# Altium schematic symbol library IC_ADI.SCHLIB: 3169 symbols (part 130 of 181)
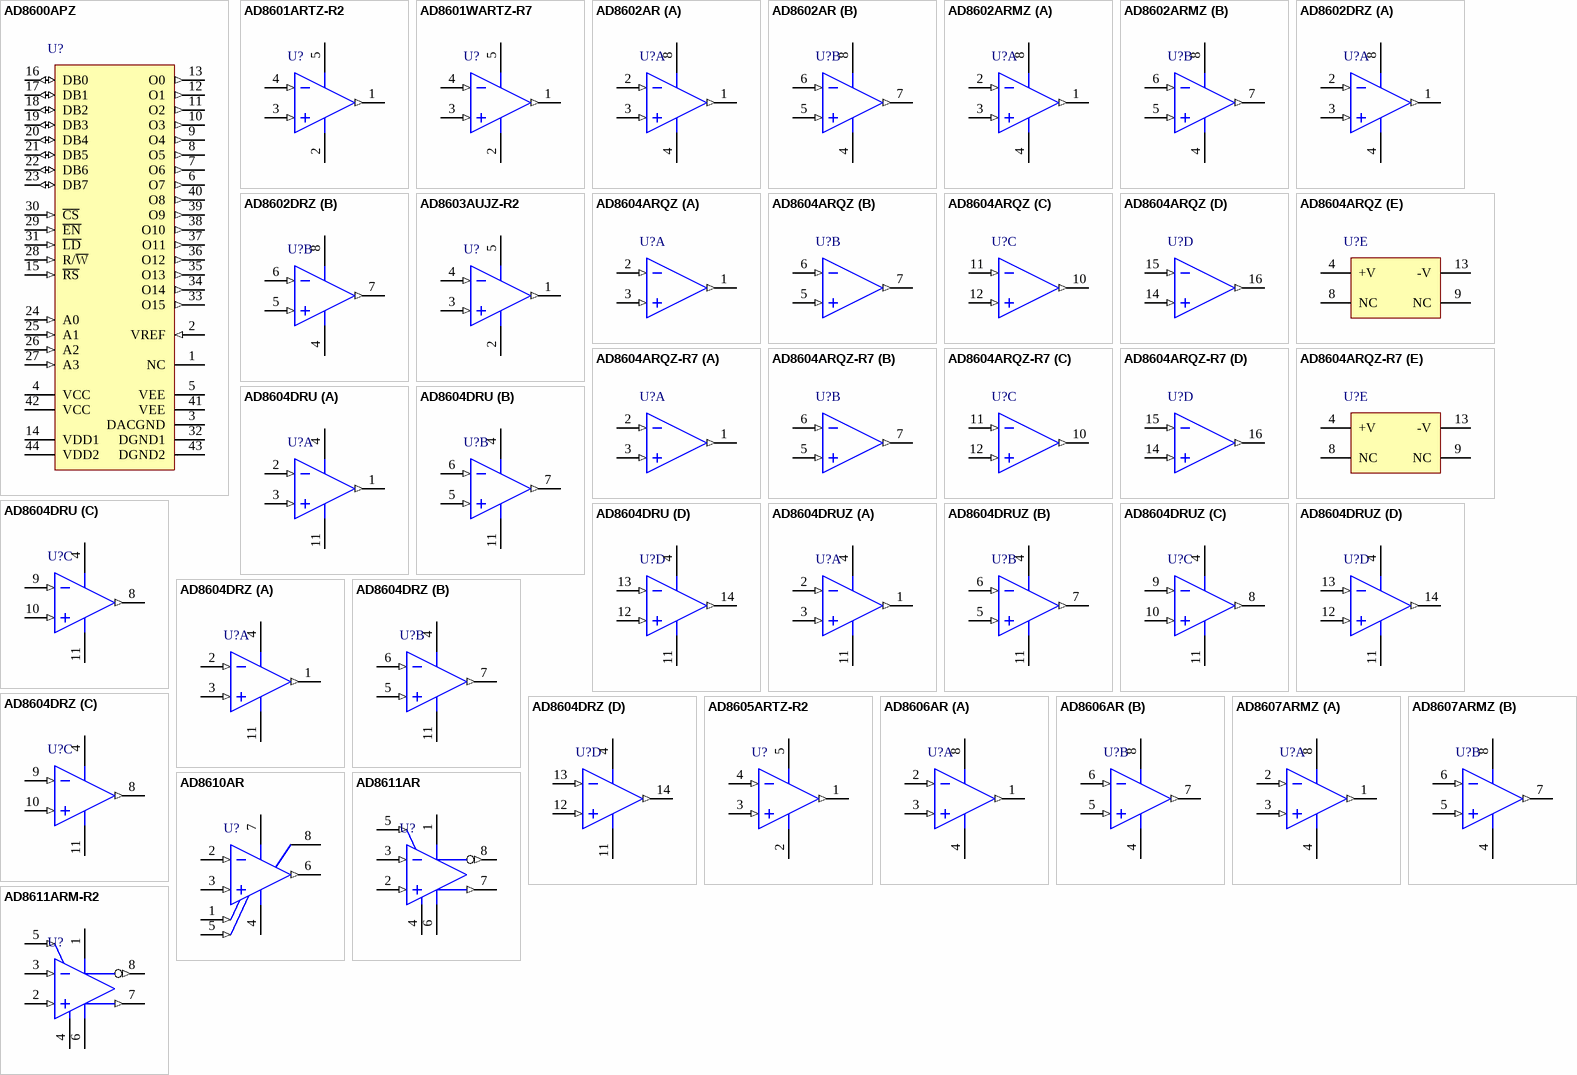
[diagram p320: symbols AD8600APZ to AD8611ARM-R2]

## AD8601ARTZ-R2
designator U?
Single Channel Wide Bandwidth Operational Amplifier, 8.4 MHz BW, 6 V/us SR, Industrial, 5-pin SOT23 (RJ-5), Reel; Generic Part Number: AD8601; PartNumber: AD8601ARTZ-R2; Amplifiers Per Package: 1; Automotive Qualified: Yes; Input Bias Current: 200fA; Input Offset Voltage: 80uV; Iq/Amp: 1.2mA; Slew Rate: 6V/us; Small Signal Bandwidth: 8.4MHz; V Span Max: 5.5V; V Span Min: 2.7V; DatasheetVersion: Rev. G; PackageVersion: 121608-A; PackageReference: RJ-5; PackageDescription: 5-Pin Small Outline Transistor Package, Body 2.9 x 1.6 mm, Pitch 0.95 mm; Supplier Part Number 1: AD8601ARTZ-R2TR-ND; Supplier Part Number 2: AD8601ARTZ-R2CT-ND; Supplier Part Number 3: AD8601ARTZ-R2DKR-ND; Supplier Part Number 4: 1319466; Supplier Part Number 5: 19M8922; Mounting Technology: Surface Mount; Code_JEDEC: MO-178-AA; ComponentLink1Description: Manufacturer URL; ComponentLink2Description: Datasheet; ComponentLink3Description: Package Specification; ComponentLink4Description: Reference Circuit
footprint SOT23-5 (Footprint not found)
pins: 1 OUT A (out), 2 -V (power), 3 +IN (in), 4 -IN (in), 5 +V (power)

## AD8601WARTZ-R7
designator U?
Single Channel Wide Bandwidth Operational Amplifier, 8.4 MHz BW, 6 V/us SR, Automotive, 5-pin SOT23 (RJ-5), Reel; Generic Part Number: AD8601; PartNumber: AD8601WARTZ-R7; Amplifiers Per Package: 1; Automotive Qualified: Yes; Input Bias Current: 200fA; Input Offset Voltage: 80uV; Iq/Amp: 1.2mA; Slew Rate: 6V/us; Small Signal Bandwidth: 8.4MHz; V Span Max: 5.5V; V Span Min: 2.7V; DatasheetVersion: Rev. G; PackageVersion: 121608-A; PackageReference: RJ-5; PackageDescription: 5-Pin Small Outline Transistor Package, Body 2.9 x 1.6 mm, Pitch 0.95 mm; Supplier Part Number 1: AD8601WARTZ-R7TR-ND; Supplier Part Number 2: AD8601WARTZ-R7CT-ND; Supplier Part Number 3: AD8601WARTZ-R7DKR-ND; Mounting Technology: Surface Mount; Code_JEDEC: MO-178-AA; ComponentLink1Description: Manufacturer URL; ComponentLink2Description: Datasheet; ComponentLink3Description: Package Specification; ComponentLink4Description: Reference Circuit
footprint SOT23-5 (Footprint not found)
pins: 1 OUT A (out), 2 -V (power), 3 +IN (in), 4 -IN (in), 5 +V (power)

## AD8602AR
designator U?
Double Channel Wide Bandwidth Operational Amplifier, 8.4 MHz BW, 6 V/us SR, Industrial, 8-pin SOIC (R-8), Tube; Generic Part Number: AD8602; PartNumber: AD8602AR; Amplifiers Per Package: 2; Automotive Qualified: Yes; Input Bias Current: 200fA; Input Offset Voltage: 500uV; Iq/Amp: 1.2mA; Slew Rate: 6V/us; Small Signal Bandwidth: 8.4MHz; V Span Max: 6V; V Span Min: 2.7V; DatasheetVersion: Rev. G; PackageVersion: 060506-A; PackageReference: R-8; PackageDescription: 8-Pin Standard Small Outline Package, Body 3.9 x 4.9 mm, Pitch 1.27 mm; Supplier Part Number 1: AD8602AR-ND; Mounting Technology: Surface Mount; Code_JEDEC: MS-012-AA; ComponentLink1Description: Manufacturer URL; ComponentLink2Description: Datasheet; ComponentLink3Description: Package Specification
footprint SOIC8_1.27 (Footprint not found)
pins on every part: 4 -V (power), 8 +V (power)
part A pins: 1 OUT A (out), 2 -IN A (in), 3 +IN A (in)
part B pins: 5 +IN B (in), 6 -IN B (in), 7 OUT B (out)

## AD8602ARMZ
designator U?
Double Channel Wide Bandwidth Operational Amplifier, 8.4 MHz BW, 6 V/us SR, Industrial, 8-pin SOP (RM-8), Tube; Generic Part Number: AD8602; PartNumber: AD8602ARMZ; Amplifiers Per Package: 2; Automotive Qualified: Yes; Input Bias Current: 200fA; Input Offset Voltage: 500uV; Iq/Amp: 1.2mA; Slew Rate: 6V/us; Small Signal Bandwidth: 8.4MHz; V Span Max: 6V; V Span Min: 2.7V; DatasheetVersion: Rev. G; PackageReference: RM-8; PackageDescription: 8-Pin Mini Small Outline Package, Body 3 x 3 mm, Pitch 0.65 mm; Supplier Part Number 1: AD8602ARMZ-ND; Supplier Part Number 2: 1838872; Supplier Part Number 3: 19P8306; Mounting Technology: Surface Mount; Code_JEDEC: MO-187-AA; ComponentLink1Description: Manufacturer URL; ComponentLink2Description: Datasheet; ComponentLink3Description: Package Specification
footprint VSSOP8_0.65 (Footprint not found)
pins on every part: 4 -V (power), 8 +V (power)
part A pins: 1 OUT A (out), 2 -IN A (in), 3 +IN A (in)
part B pins: 5 +IN B (in), 6 -IN B (in), 7 OUT B (out)

## AD8602DRZ
designator U?
Double Channel Wide Bandwidth Operational Amplifier, 8.4 MHz BW, 6 V/us SR, Industrial, 8-pin SOIC (R-8), Tube; Generic Part Number: AD8602; PartNumber: AD8602DRZ; Amplifiers Per Package: 2; Automotive Qualified: Yes; Input Bias Current: 200fA; Input Offset Voltage: 500uV; Iq/Amp: 1.2mA; Slew Rate: 6V/us; Small Signal Bandwidth: 8.4MHz; V Span Max: 6V; V Span Min: 2.7V; DatasheetVersion: Rev. G; PackageVersion: 060506-A; PackageReference: R-8; PackageDescription: 8-Pin Standard Small Outline Package, Body 3.9 x 4.9 mm, Pitch 1.27 mm; Supplier Part Number 1: AD8602DRZ-ND; Supplier Part Number 2: 59K6900; Mounting Technology: Surface Mount; Code_JEDEC: MS-012-AA; ComponentLink1Description: Manufacturer URL; ComponentLink2Description: Datasheet; ComponentLink3Description: Package Specification
footprint SOIC8_1.27 (Footprint not found)
pins on every part: 4 -V (power), 8 +V (power)
part A pins: 1 OUT A (out), 2 -IN A (in), 3 +IN A (in)
part B pins: 5 +IN B (in), 6 -IN B (in), 7 OUT B (out)

## AD8603AUJZ-R2
designator U?
Single Channel Single-Supply Operation Operational Amplifier, 400 KHz BW, 100 mV/us SR, Industrial, 5-pin SOT23 (UJ-5), Reel; Generic Part Number: AD8603; PartNumber: AD8603AUJZ-R2; Amplifiers Per Package: 1; Input Bias Current: 200fA; Input Offset Voltage: 12uV; Iq/Amp: 50uA; Small Signal Bandwidth: 400KHz; V Span Max: 6V; V Span Min: 1.8V; DatasheetVersion: Rev. C; PackageVersion: 100708-A; PackageReference: UJ-5; PackageDescription: 5-Pin Thin Small Outline Transistor Package, Body 2.9 x 1.6 mm, Pitch 0.95 mm; Supplier Part Number 1: AD8603AUJZ-R2TR-ND; Supplier Part Number 2: AD8603AUJZ-R2CT-ND; Supplier Part Number 3: AD8603AUJZ-R2DKR-ND; Supplier Part Number 4: 1319467; Supplier Part Number 5: 19M8923; Supplier Part Number 6: 59K6905; Slew Rate: 100mV/us; Mounting Technology: Surface Mount; Code_JEDEC: MO-193-AB; ComponentLink1Description: Manufacturer URL; ComponentLink2Description: Datasheet; ComponentLink3Description: Package Specification; ComponentLink4Description: Reference Circuit
footprint SOT23-5 (Footprint not found)
pins: 1 OUT (out), 2 -V (power), 3 +IN (in), 4 -IN (in), 5 +V (power)

## AD8604ARQZ
designator U?
Quad Channel Wide Bandwidth Operational Amplifier, 8.4 MHz BW, 6 V/us SR, Industrial, 16-pin SOP (RQ-16), Tube; Generic Part Number: AD8604; PartNumber: AD8604ARQZ; Amplifiers Per Package: 4; Input Bias Current: 200fA; Input Offset Voltage: 500uV; Iq/Amp: 1.2mA; Slew Rate: 6V/us; Small Signal Bandwidth: 8.4MHz; V Span Max: 6V; V Span Min: 2.7V; DatasheetVersion: Rev. G; PackageReference: RQ-16; PackageDescription: 16-Pin Shrink Small Outline Package, Body 4.9 x 3.9 mm, Pitch 0.64 mm; Supplier Part Number 1: AD8604ARQZ-ND; Supplier Part Number 2: 70R1843; Mounting Technology: Surface Mount; Code_JEDEC: MO-137-AB; ComponentLink1Description: Manufacturer URL; ComponentLink2Description: Datasheet; ComponentLink3Description: Package Specification
footprint SSOP16_0.65(5X4) (Footprint not found)
part A pins: 1 OUT A (out), 2 -IN A (in), 3 +IN A (in)
part B pins: 5 +IN B (in), 6 -IN B (in), 7 OUT B (out)
part C pins: 10 OUT C (out), 11 -IN C (in), 12 +IN C (in)
part D pins: 14 +IN D (in), 15 -IN D (in), 16 OUT D (out)
part E pins: 4 +V (power), 8 NC, 9 NC, 13 -V (power)

## AD8604ARQZ-R7
designator U?
Quad Channel Wide Bandwidth Operational Amplifier, 8.4 MHz BW, 6 V/us SR, Industrial, 16-pin SOP (RQ-16), Reel; Generic Part Number: AD8604; PartNumber: AD8604ARQZ-R7; Amplifiers Per Package: 4; Input Bias Current: 200fA; Input Offset Voltage: 500uV; Iq/Amp: 1.2mA; Slew Rate: 6V/us; Small Signal Bandwidth: 8.4MHz; V Span Max: 6V; V Span Min: 2.7V; DatasheetVersion: Rev. G; PackageReference: RQ-16; PackageDescription: 16-Pin Shrink Small Outline Package, Body 4.9 x 3.9 mm, Pitch 0.64 mm; Supplier Part Number 1: AD8604ARQZ-R7-ND; Supplier Part Number 2: 70R1845; Mounting Technology: Surface Mount; Code_JEDEC: MO-137-AB; ComponentLink1Description: Manufacturer URL; ComponentLink2Description: Datasheet; ComponentLink3Description: Package Specification
footprint SSOP16_0.65(5X4) (Footprint not found)
part A pins: 1 OUT A (out), 2 -IN A (in), 3 +IN A (in)
part B pins: 5 +IN B (in), 6 -IN B (in), 7 OUT B (out)
part C pins: 10 OUT C (out), 11 -IN C (in), 12 +IN C (in)
part D pins: 14 +IN D (in), 15 -IN D (in), 16 OUT D (out)
part E pins: 4 +V (power), 8 NC, 9 NC, 13 -V (power)

## AD8604DRU
designator U?
Quad Channel Wide Bandwidth Operational Amplifier, 8.4 MHz BW, 6 V/us SR, Industrial, 14-pin SOP (RU-14), Tube; Generic Part Number: AD8604; PartNumber: AD8604DRU; Amplifiers Per Package: 4; Input Bias Current: 200fA; Input Offset Voltage: 500uV; Iq/Amp: 1.2mA; Slew Rate: 6V/us; Small Signal Bandwidth: 8.4MHz; V Span Max: 6V; V Span Min: 2.7V; DatasheetVersion: Rev. G; PackageReference: RU-14; PackageDescription: 14-Pin Thin Shrink Small Outline Package, Body 5 x 4.4 mm, Pitch 0.65 mm; Supplier Part Number 1: AD8604DRU-ND; Mounting Technology: Surface Mount; Code_JEDEC: MO-153AB-1; ComponentLink1Description: Manufacturer URL; ComponentLink2Description: Datasheet; ComponentLink3Description: Package Specification
footprint TSSOP14_0.65 (Footprint not found)
pins on every part: 4 +V (power), 11 -V (power)
part A pins: 1 OUT A (out), 2 -IN A (in), 3 +IN A (in)
part B pins: 5 +IN B (in), 6 -IN B (in), 7 OUT B (out)
part C pins: 8 OUT C (out), 9 -IN C (in), 10 +IN C (in)
part D pins: 12 +IN D (in), 13 -IN D (in), 14 OUT D (out)

## AD8604DRUZ
designator U?
Quad Channel Wide Bandwidth Operational Amplifier, 8.4 MHz BW, 6 V/us SR, Industrial, 14-pin SOP (RU-14), Tube; Generic Part Number: AD8604; PartNumber: AD8604DRUZ; Amplifiers Per Package: 4; Input Bias Current: 200fA; Input Offset Voltage: 500uV; Iq/Amp: 1.2mA; Slew Rate: 6V/us; Small Signal Bandwidth: 8.4MHz; V Span Max: 6V; V Span Min: 2.7V; DatasheetVersion: Rev. G; PackageReference: RU-14; PackageDescription: 14-Pin Thin Shrink Small Outline Package, Body 5 x 4.4 mm, Pitch 0.65 mm; Supplier Part Number 1: AD8604DRUZ-ND; Mounting Technology: Surface Mount; Code_JEDEC: MO-153AB-1; ComponentLink1Description: Manufacturer URL; ComponentLink2Description: Datasheet; ComponentLink3Description: Package Specification
footprint TSSOP14_0.65 (Footprint not found)
pins on every part: 4 +V (power), 11 -V (power)
part A pins: 1 OUT A (out), 2 -IN A (in), 3 +IN A (in)
part B pins: 5 +IN B (in), 6 -IN B (in), 7 OUT B (out)
part C pins: 8 OUT C (out), 9 -IN C (in), 10 +IN C (in)
part D pins: 12 +IN D (in), 13 -IN D (in), 14 OUT D (out)

## AD8604DRZ
designator U?
Quad Channel Wide Bandwidth Operational Amplifier, 8.4 MHz BW, 6 V/us SR, Industrial, 14-pin SOIC (R-14), Tube; Generic Part Number: AD8604; PartNumber: AD8604DRZ; Amplifiers Per Package: 4; Input Bias Current: 200fA; Input Offset Voltage: 500uV; Iq/Amp: 1.2mA; Slew Rate: 6V/us; Small Signal Bandwidth: 8.4MHz; V Span Max: 6V; V Span Min: 2.7V; DatasheetVersion: Rev. G; PackageVersion: 060606-A; PackageReference: R-14; PackageDescription: 14-Pin Standard Small Outline Package, Body 8.65 x 3.9 mm, Pitch 1.27 mm; Supplier Part Number 1: AD8604DRZ-ND; Mounting Technology: Surface Mount; Code_JEDEC: MS-012-AB; ComponentLink1Description: Manufacturer URL; ComponentLink2Description: Datasheet; ComponentLink3Description: Package Specification
footprint SOIC14_1.27 (Footprint not found)
pins on every part: 4 +V (power), 11 -V (power)
part A pins: 1 OUT A (out), 2 -IN A (in), 3 +IN A (in)
part B pins: 5 +IN B (in), 6 -IN B (in), 7 OUT B (out)
part C pins: 8 OUT C (out), 9 -IN C (in), 10 +IN C (in)
part D pins: 12 +IN D (in), 13 -IN D (in), 14 OUT D (out)

## AD8605ARTZ-R2
designator U?
Single Channel Wide Bandwidth Operational Amplifier, 10 MHz BW, 5 V/us SR, Industrial, 5-pin SOT23 (RJ-5), Reel; Generic Part Number: AD8605; PartNumber: AD8605ARTZ-R2; Amplifiers Per Package: 1; Input Bias Current: 200fA; Input Offset Voltage: 20uV; Iq/Amp: 1.2mA; Slew Rate: 5V/us; Small Signal Bandwidth: 10MHz; V Span Max: 6V; V Span Min: 2.7V; DatasheetVersion: Rev. L; PackageVersion: 121608-A; PackageReference: RJ-5; PackageDescription: 5-Pin Small Outline Transistor Package, Body 2.9 x 1.6 mm, Pitch 0.95 mm; Supplier Part Number 1: AD8605ARTZ-R2TR-ND; Supplier Part Number 2: AD8605ARTZ-R2DKR-ND; Supplier Part Number 3: 1424172; Supplier Part Number 4: 59K6919; Mounting Technology: Surface Mount; Code_JEDEC: MO-178-AA; ComponentLink1Description: Manufacturer URL; ComponentLink2Description: Datasheet; ComponentLink3Description: Package Specification; ComponentLink4Description: Reference Circuit
footprint SOT23-5 (Footprint not found)
pins: 1 OUT (out), 2 -V (power), 3 +IN (in), 4 -IN (in), 5 +V (power)

## AD8606AR
designator U?
Double Channel Wide Bandwidth Operational Amplifier, 10 MHz BW, 5 V/us SR, Industrial, 8-pin SOIC (R-8), Tube; Generic Part Number: AD8606; PartNumber: AD8606AR; Amplifiers Per Package: 2; Input Bias Current: 200fA; Input Offset Voltage: 20uV; Iq/Amp: 1.2mA; Slew Rate: 5V/us; Small Signal Bandwidth: 10MHz; V Span Max: 6V; V Span Min: 2.7V; DatasheetVersion: Rev. L; PackageVersion: 060506-A; PackageReference: R-8; PackageDescription: 8-Pin Standard Small Outline Package, Body 3.9 x 4.9 mm, Pitch 1.27 mm; Supplier Part Number 1: AD8606AR-ND; Mounting Technology: Surface Mount; Code_JEDEC: MS-012-AA; ComponentLink1Description: Manufacturer URL; ComponentLink2Description: Datasheet; ComponentLink3Description: Package Specification; ComponentLink4Description: Reference Circuit
footprint SOIC8_1.27 (Footprint not found)
pins on every part: 4 -V (power), 8 +V (power)
part A pins: 1 OUT A (out), 2 -IN A (in), 3 +IN A (in)
part B pins: 5 +IN B (in), 6 -IN B (in), 7 OUT B (out)

## AD8607ARMZ
designator U?
Double Channel Single-Supply Operation Operational Amplifier, 400 KHz BW, 100 mV/us SR, Industrial, 8-pin SOP (RM-8), Tube; Generic Part Number: AD8607; PartNumber: AD8607ARMZ; Amplifiers Per Package: 2; Input Bias Current: 200fA; Input Offset Voltage: 12uV; Iq/Amp: 50uA; Small Signal Bandwidth: 400KHz; V Span Max: 5V; V Span Min: 1.8V; DatasheetVersion: Rev. C; PackageReference: RM-8; PackageDescription: 8-Pin Mini Small Outline Package, Body 3 x 3 mm, Pitch 0.65 mm; Supplier Part Number 1: AD8607ARMZ-ND; Supplier Part Number 2: 1776879; Supplier Part Number 3: 34P3246; Slew Rate: 100mV/us; Mounting Technology: Surface Mount; Code_JEDEC: MO-187-AA; ComponentLink1Description: Manufacturer URL; ComponentLink2Description: Datasheet; ComponentLink3Description: Package Specification
footprint VSSOP8_0.65 (Footprint not found)
pins on every part: 4 -V (power), 8 +V (power)
part A pins: 1 OUT A (out), 2 -IN A (in), 3 +IN A (in)
part B pins: 5 +IN B (in), 6 -IN B (in), 7 OUT B (out)

## AD8610AR
designator U?
Single Channel Low Offset Voltage Operational Amplifier, 25 MHz BW, 50 V/us SR, Industrial, 8-pin SOIC (R-8), Tube; Generic Part Number: AD8610; PartNumber: AD8610AR; Amplifiers Per Package: 1; Input Bias Current: 2pA; Input Offset Voltage: 85uV; Iq/Amp: 3.5mA; Slew Rate: 50V/us; Small Signal Bandwidth: 25MHz; V Span Max: 27V; V Span Min: 10V; DatasheetVersion: Rev. F; PackageVersion: 060506-A; PackageReference: R-8; PackageDescription: 8-Pin Standard Small Outline Package, Body 3.9 x 4.9 mm, Pitch 1.27 mm; Supplier Part Number 1: AD8610AR-ND; Mounting Technology: Surface Mount; Code_JEDEC: MS-012-AA; ComponentLink1Description: Manufacturer URL; ComponentLink2Description: Datasheet; ComponentLink3Description: Package Specification; ComponentLink4Description: Reference Circuit
footprint SOIC8_1.27 (Footprint not found)
pins: 1 NULL (in), 2 -IN (in), 3 +IN (in), 4 -V (power), 5 NULL (in), 6 OUT (out), 7 +V (power), 8 NC

## AD8611AR
designator U?
Ultrafast, Single-Supply Comparator, 3 to 5 V, 5.5 ns Delay, Industrial, 8-pin SOIC (R-8), Tube; PartNumber: AD8611AR; Input Range (V): 0 to 3; Total Power (mW): 50mW; Voltage Supply (V): 3 to 5; DatasheetVersion: Rev. A; PackageVersion: 060506-A, 06/2006; PackageReference: R-8; PackageDescription: 8-Pin Standard Small Outline Package, Body 4.9 x 3.9 mm, Pitch 1.27 mm; Supplier Part Number 1: AD8611AR-ND; Supplier Part Number 2: 584-AD8611AR; Packing: Tube; Mounting Technology: Surface Mount; Code_JEDEC: MS-012-AA; ComponentLink1Description: Manufacturer URL; ComponentLink2Description: Datasheet; ComponentLink3Description: Package Specification; ComponentLink4Description: URL Link1
footprint SOIC8_1.27 (Footprint not found)
pins: 1 V+ (power) "Positive Supply Terminal.", 2 +IN (in) "Noninverting Analog Input of the Differential Input Stage.", 3 -IN (in) "Inverting Analog Input of the Differential Input Stage.", 4 V- (power) "Negative Supply Terminal.", 5 LATCH (in) "Latch Enable Input.", 6 GND (power) "Negative Logic Supply", 7 QA (out) "One of Two Complementary Output for Channel A.", 8 ~{QA} (out) "One of Two Complementary Output for Channel A."

## AD8611ARM-R2
designator U?
Ultrafast, Single-Supply Comparator, 3 to 5 V, 5.5 ns Delay, Industrial, 8-pin SOP (RM-8), Reel; PartNumber: AD8611ARM-R2; Input Range (V): 0 to 3; Total Power (mW): 50mW; Voltage Supply (V): 3 to 5; DatasheetVersion: Rev. A; PackageVersion: Aug-05; PackageReference: RM-8; PackageDescription: 8-Pin Mini Small Outline Package, Body 3 x 3 mm, Pitch 0.65 mm; Supplier Part Number 1: AD8611ARM-R2-ND; Supplier Part Number 2: N/A; Packing: Reel; Mounting Technology: Surface Mount; Code_JEDEC: MO-187-AA; ComponentLink1Description: Manufacturer URL; ComponentLink2Description: Datasheet; ComponentLink3Description: Package Specification; ComponentLink4Description: URL Link1
footprint VSSOP8_0.65 (Footprint not found)
pins: 1 V+ (power) "Positive Supply Terminal.", 2 +IN (in) "Noninverting Analog Input of the Differential Input Stage.", 3 -IN (in) "Inverting Analog Input of the Differential Input Stage.", 4 V- (power) "Negative Supply Terminal.", 5 LATCH (in) "Latch Enable Input.", 6 GND (power) "Negative Logic Supply", 7 QA (out) "One of Two Complementary Output for Channel A.", 8 ~{QA} (out) "One of Two Complementary Output for Channel A."

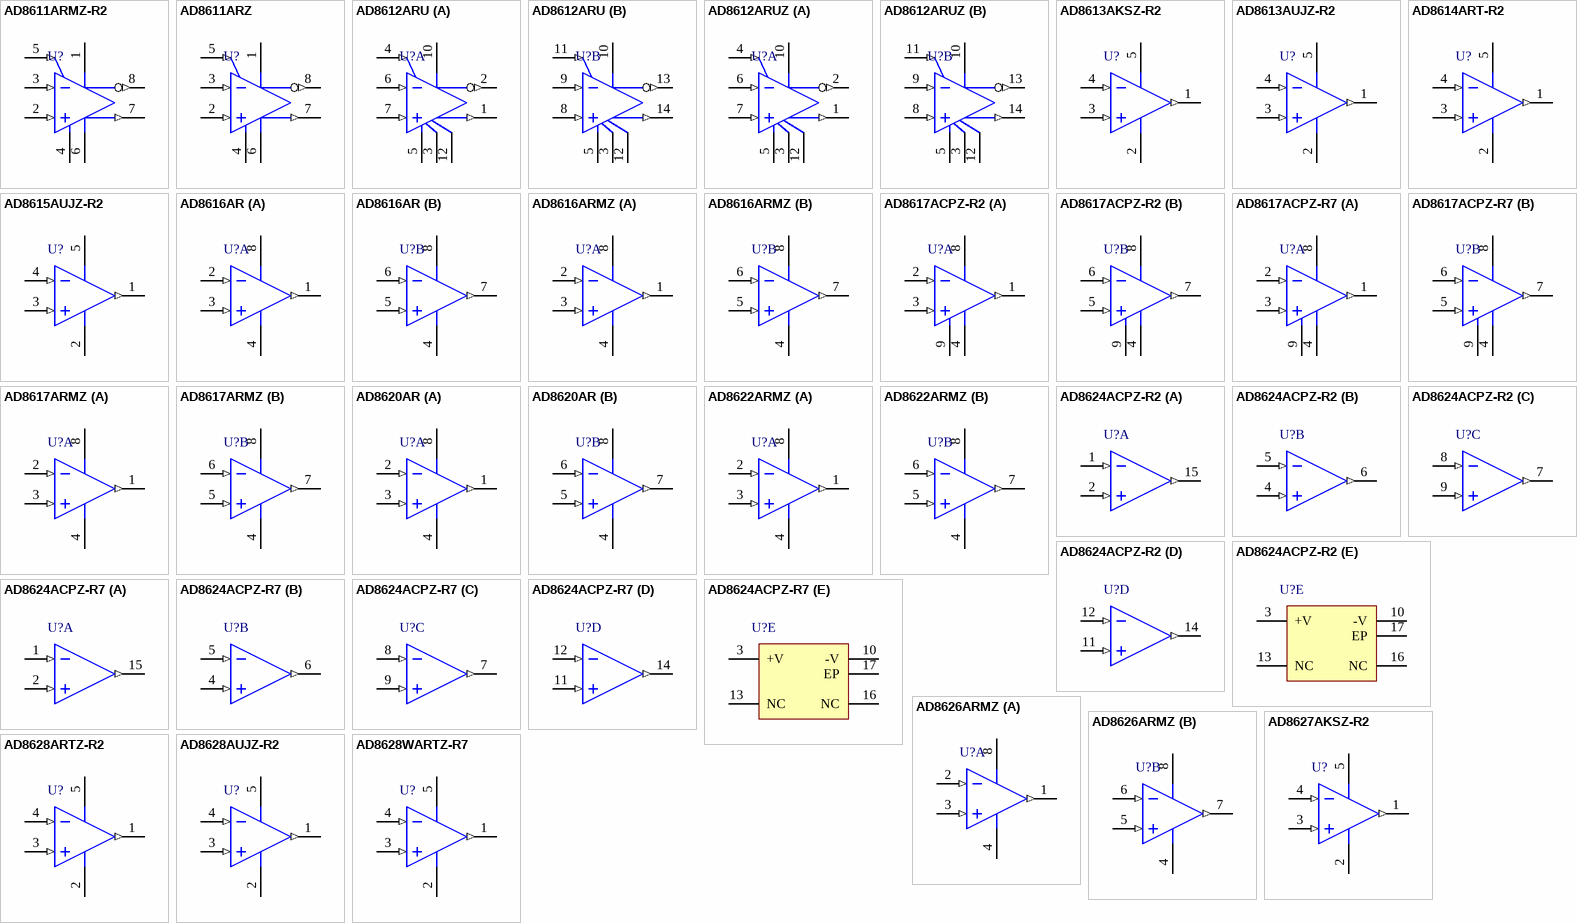
[diagram p98: symbols AD8611ARMZ-R2 to AD8628WARTZ-R7]

## AD8611ARMZ-R2
designator U?
Ultrafast, Single-Supply Comparator, 3 to 5 V, 5.5 ns Delay, Industrial, 8-pin SOP (RM-8), Reel; PartNumber: AD8611ARMZ-R2; Input Range (V): 0 to 3; Total Power (mW): 50mW; Voltage Supply (V): 3 to 5; DatasheetVersion: Rev. A; PackageVersion: Aug-05; PackageReference: RM-8; PackageDescription: 8-Pin Mini Small Outline Package, Body 3 x 3 mm, Pitch 0.65 mm; Supplier Part Number 1: AD8611ARMZ-R2TR-ND; Supplier Part Number 2: AD8611ARMZ-R2CT-ND; Supplier Part Number 3: AD8611ARMZ-R2DKR-ND; Supplier Part Number 4: 1651268; Supplier Part Number 5: 584-AD8611ARMZ-R2; Packing: Reel; Mounting Technology: Surface Mount; Code_JEDEC: MO-187-AA; ComponentLink1Description: Manufacturer URL; ComponentLink2Description: Datasheet; ComponentLink3Description: Package Specification; ComponentLink4Description: URL Link1
footprint VSSOP8_0.65 (Footprint not found)
pins: 1 V+ (power) "Positive Supply Terminal.", 2 +IN (in) "Noninverting Analog Input of the Differential Input Stage.", 3 -IN (in) "Inverting Analog Input of the Differential Input Stage.", 4 V- (power) "Negative Supply Terminal.", 5 LATCH (in) "Latch Enable Input.", 6 GND (power) "Negative Logic Supply", 7 QA (out) "One of Two Complementary Output for Channel A.", 8 ~{QA} (out) "One of Two Complementary Output for Channel A."

## AD8611ARZ
designator U?
Ultrafast, Single-Supply Comparator, 3 to 5 V, 5.5 ns Delay, Industrial, 8-pin SOIC (R-8), Tube; PartNumber: AD8611ARZ; Input Range (V): 0 to 3; Total Power (mW): 50mW; Voltage Supply (V): 3 to 5; DatasheetVersion: Rev. A; PackageVersion: 060506-A, 06/2006; PackageReference: R-8; PackageDescription: 8-Pin Standard Small Outline Package, Body 4.9 x 3.9 mm, Pitch 1.27 mm; Supplier Part Number 1: AD8611ARZ-ND; Supplier Part Number 2: 9604324; Supplier Part Number 3: 584-AD8611ARZ; Packing: Tube; Mounting Technology: Surface Mount; Code_JEDEC: MS-012-AA; ComponentLink1Description: Manufacturer URL; ComponentLink2Description: Datasheet; ComponentLink3Description: Package Specification; ComponentLink4Description: URL Link1
footprint SOIC8_1.27 (Footprint not found)
pins: 1 V+ (power) "Positive Supply Terminal.", 2 +IN (in) "Noninverting Analog Input of the Differential Input Stage.", 3 -IN (in) "Inverting Analog Input of the Differential Input Stage.", 4 V- (power) "Negative Supply Terminal.", 5 LATCH (in) "Latch Enable Input.", 6 GND (power) "Negative Logic Supply", 7 QA (out) "One of Two Complementary Output for Channel A.", 8 ~{QA} (out) "One of Two Complementary Output for Channel A."

## AD8612ARU
designator U?
Ultrafast, Single-Supply Comparator, 3 to 5 V, 5.5 ns Delay, Industrial, 14-pin SOP (RU-14), Tube; PartNumber: AD8612ARU; Input Range (V): 0 to 3; Total Power (mW): 100mW; Voltage Supply (V): 3 to 5; DatasheetVersion: Rev. A; PackageVersion: Aug-02; PackageReference: RU-14; PackageDescription: 14-Pin Thin Shrink Small Outline Package, Body 5 x 4.4 mm, Pitch 0.65 mm; Supplier Part Number 1: AD8612ARU-ND; Supplier Part Number 2: 584-AD8612ARU; Packing: Tube; Mounting Technology: Surface Mount; Code_JEDEC: MO-153AB-1; ComponentLink1Description: Manufacturer URL; ComponentLink2Description: Datasheet; ComponentLink3Description: Package Specification; ComponentLink4Description: URL Link1
footprint TSSOP14_0.65 (Footprint not found)
pins on every part: 3 GND (power) "Negative Logic Supply", 5 V- (power) "Negative Supply Terminal.", 10 V+ (power) "Positive Supply Terminal.", 12 GND (power) "Negative Logic Supply"
part A pins: 1 QA (out) "One of Two Complementary Output for Channel A.", 2 ~{QA} (out) "One of Two Complementary Output for Channel A.", 4 LEA (in) "Channel A Latch Enable.", 6 INA- (in) "Inverting Analog Input of the Differential Input Stage for Channel A.", 7 INA+ (in) "Noninverting Analog Input of the Differential Input Stage for Channel A."
part B pins: 8 INB+ (in) "Noninverting Analog Input of the Differential Input Stage for Channel B.", 9 INB- (in) "Inverting Analog Input of the Differential Input Stage for Channel B.", 11 LEB (in) "Channel B Latch Enable.", 13 ~{QB} (out) "One of Two Complementary Output for Channel B.", 14 QB (out) "One of Two Complementary Output for Channel B."

## AD8612ARUZ
designator U?
Ultrafast, Single-Supply Comparator, 3 to 5 V, 5.5 ns Delay, Industrial, 14-pin SOP (RU-14), Tube; PartNumber: AD8612ARUZ; Input Range (V): 0 to 3; Total Power (mW): 100mW; Voltage Supply (V): 3 to 5; DatasheetVersion: Rev. A; PackageVersion: Aug-02; PackageReference: RU-14; PackageDescription: 14-Pin Thin Shrink Small Outline Package, Body 5 x 4.4 mm, Pitch 0.65 mm; Supplier Part Number 1: AD8612ARUZ-ND; Supplier Part Number 2: 1438900; Supplier Part Number 3: 584-AD8612ARUZ; Packing: Tube; Mounting Technology: Surface Mount; Code_JEDEC: MO-153AB-1; ComponentLink1Description: Manufacturer URL; ComponentLink2Description: Datasheet; ComponentLink3Description: Package Specification; ComponentLink4Description: URL Link1
footprint TSSOP14_0.65 (Footprint not found)
pins on every part: 3 GND (power) "Negative Logic Supply", 5 V- (power) "Negative Supply Terminal.", 10 V+ (power) "Positive Supply Terminal.", 12 GND (power) "Negative Logic Supply"
part A pins: 1 QA (out) "One of Two Complementary Output for Channel A.", 2 ~{QA} (out) "One of Two Complementary Output for Channel A.", 4 LEA (in) "Channel A Latch Enable.", 6 INA- (in) "Inverting Analog Input of the Differential Input Stage for Channel A.", 7 INA+ (in) "Noninverting Analog Input of the Differential Input Stage for Channel A."
part B pins: 8 INB+ (in) "Noninverting Analog Input of the Differential Input Stage for Channel B.", 9 INB- (in) "Inverting Analog Input of the Differential Input Stage for Channel B.", 11 LEB (in) "Channel B Latch Enable.", 13 ~{QB} (out) "One of Two Complementary Output for Channel B.", 14 QB (out) "One of Two Complementary Output for Channel B."

## AD8613AKSZ-R2
designator U?
Single Channel Single-Supply Operation Operational Amplifier, 400 KHz BW, 100 mV/us SR, Industrial, 5-pin SOT23 (KS-5), Reel; Generic Part Number: AD8613; PartNumber: AD8613AKSZ-R2; Amplifiers Per Package: 1; Input Bias Current: 200fA; Input Offset Voltage: 400uV; Iq/Amp: 38uA; Small Signal Bandwidth: 400KHz; V Span Max: 5V; V Span Min: 1.8V; DatasheetVersion: Rev. E; PackageVersion: 072809-A; PackageReference: KS-5; PackageDescription: 5-Pin Thin Shrink Small Outline Transistor Package, Body 2 x 1.25 mm, Pitch 0.65 mm; Supplier Part Number 1: AD8613AKSZ-R2TR-ND; Supplier Part Number 2: AD8613AKSZ-R2CT-ND; Supplier Part Number 3: AD8613AKSZ-R2DKR-ND; Supplier Part Number 4: 1837303; Supplier Part Number 5: 12M9122; Slew Rate: 100mV/us; Mounting Technology: Surface Mount; Code_JEDEC: MO-203-AA; ComponentLink1Description: Manufacturer URL; ComponentLink2Description: Datasheet; ComponentLink3Description: Package Specification
footprint SOT353 (Footprint not found)
pins: 1 OUT (out), 2 -V (power), 3 +IN (in), 4 -IN (in), 5 +V (power)

## AD8613AUJZ-R2
designator U?
Single Channel Single-Supply Operation Operational Amplifier, 400 KHz BW, 100 mV/us SR, Industrial, 5-pin SOT23 (UJ-5), Reel; Generic Part Number: AD8613; PartNumber: AD8613AUJZ-R2; Amplifiers Per Package: 1; Input Bias Current: 200fA; Input Offset Voltage: 400uV; Iq/Amp: 38uA; Small Signal Bandwidth: 400KHz; V Span Max: 5V; V Span Min: 1.8V; DatasheetVersion: Rev. E; PackageVersion: 100708-A; PackageReference: UJ-5; PackageDescription: 5-Pin Thin Small Outline Transistor Package, Body 2.9 x 1.6 mm, Pitch 0.95 mm; Supplier Part Number 1: AD8613AUJZ-R2TR-ND; Supplier Part Number 2: AD8613AUJZ-R2CT-ND; Supplier Part Number 3: AD8613AUJZ-R2DKR-ND; Supplier Part Number 4: 1333262RL; Supplier Part Number 5: 1333262; Supplier Part Number 6: 12M9125; Slew Rate: 100mV/us; Mounting Technology: Surface Mount; Code_JEDEC: MO-193-AB; ComponentLink1Description: Manufacturer URL; ComponentLink2Description: Datasheet; ComponentLink3Description: Package Specification
footprint SOT23-5 (Footprint not found)
pins: 1 OUT (out), 2 -V (power), 3 +IN (in), 4 -IN (in), 5 +V (power)

## AD8614ART-R2
designator U?
Single Channel Single-Supply Operation Operational Amplifier, 5.5 MHz BW, 7.5 V/us SR, Industrial, 5-pin SOT23 (RJ-5), Reel; Generic Part Number: AD8614; PartNumber: AD8614ART-R2; Amplifiers Per Package: 1; Input Bias Current: 80nA; Input Offset Voltage: 1mV; Iq/Amp: 0.8mA; Small Signal Bandwidth: 5.5MHz; V Span Max: 18V; V Span Min: 5V; DatasheetVersion: Rev. B; PackageVersion: 121608-A; PackageReference: RJ-5; PackageDescription: 5-Pin Small Outline Transistor Package, Body 2.9 x 1.6 mm, Pitch 0.95 mm; Supplier Part Number 1: AD8614ART-R2-ND; Supplier Part Number 2: 02H2008; Slew Rate: 7.5V/us; Mounting Technology: Surface Mount; Code_JEDEC: MO-178-AA; ComponentLink1Description: Manufacturer URL; ComponentLink2Description: Datasheet; ComponentLink3Description: Package Specification
footprint SOT23-5 (Footprint not found)
pins: 1 OUT A (out), 2 -V (power), 3 +IN (in), 4 -IN (in), 5 +V (power)

## AD8615AUJZ-R2
designator U?
Single Channel Wide Bandwidth Operational Amplifier, 23 MHz BW, 12 V/us SR, Industrial, 5-pin SOT23 (UJ-5), Reel; Generic Part Number: AD8615; PartNumber: AD8615AUJZ-R2; Amplifiers Per Package: 1; Input Bias Current: 200fA; Input Offset Voltage: 80uV; Iq/Amp: 1.7mA; Slew Rate: 12V/us; Small Signal Bandwidth: 23MHz; V Span Max: 6V; V Span Min: 2.7V; DatasheetVersion: Rev. E; PackageVersion: 100708-A; PackageReference: UJ-5; PackageDescription: 5-Pin Thin Small Outline Transistor Package, Body 2.9 x 1.6 mm, Pitch 0.95 mm; Supplier Part Number 1: AD8615AUJZ-R2TR-ND; Supplier Part Number 2: AD8615AUJZ-R2CT-ND; Supplier Part Number 3: AD8615AUJZ-R2DKR-ND; Supplier Part Number 4: 19M8931; Mounting Technology: Surface Mount; Code_JEDEC: MO-193-AB; ComponentLink1Description: Manufacturer URL; ComponentLink2Description: Datasheet; ComponentLink3Description: Package Specification; ComponentLink4Description: Reference Circuit
footprint SOT23-5 (Footprint not found)
pins: 1 OUT (out), 2 -V (power), 3 +IN (in), 4 -IN (in), 5 +V (power)

## AD8616AR
designator U?
Double Channel Wide Bandwidth Operational Amplifier, 24 MHz BW, 12 V/us SR, Industrial, 8-pin SOIC (R-8), Tube; Generic Part Number: AD8616; PartNumber: AD8616AR; Amplifiers Per Package: 2; Input Bias Current: 200fA; Input Offset Voltage: 23uV; Iq/Amp: 2mA; Slew Rate: 12V/us; Small Signal Bandwidth: 24MHz; V Span Max: 6V; V Span Min: 2.7V; DatasheetVersion: Rev. E; PackageVersion: 060506-A; PackageReference: R-8; PackageDescription: 8-Pin Standard Small Outline Package, Body 3.9 x 4.9 mm, Pitch 1.27 mm; Supplier Part Number 1: AD8616AR-ND; Mounting Technology: Surface Mount; Code_JEDEC: MS-012-AA; ComponentLink1Description: Manufacturer URL; ComponentLink2Description: Datasheet; ComponentLink3Description: Package Specification
footprint SOIC8_1.27 (Footprint not found)
pins on every part: 4 -V (power), 8 +V (power)
part A pins: 1 OUT A (out), 2 -IN A (in), 3 +IN A (in)
part B pins: 5 +IN B (in), 6 -IN B (in), 7 OUT B (out)

## AD8616ARMZ
designator U?
Double Channel Wide Bandwidth Operational Amplifier, 24 MHz BW, 12 V/us SR, Industrial, 8-pin SOP (RM-8), Tube; Generic Part Number: AD8616; PartNumber: AD8616ARMZ; Amplifiers Per Package: 2; Input Bias Current: 200fA; Input Offset Voltage: 23uV; Iq/Amp: 2mA; Slew Rate: 12V/us; Small Signal Bandwidth: 24MHz; V Span Max: 6V; V Span Min: 2.7V; DatasheetVersion: Rev. E; PackageReference: RM-8; PackageDescription: 8-Pin Mini Small Outline Package, Body 3 x 3 mm, Pitch 0.65 mm; Supplier Part Number 1: AD8616ARMZ-ND; Supplier Part Number 2: 2067783; Supplier Part Number 3: 73T8199; Supplier Part Number 4: 19P8310; Mounting Technology: Surface Mount; Code_JEDEC: MO-187-AA; ComponentLink1Description: Manufacturer URL; ComponentLink2Description: Datasheet; ComponentLink3Description: Package Specification
footprint VSSOP8_0.65 (Footprint not found)
pins on every part: 4 -V (power), 8 +V (power)
part A pins: 1 OUT A (out), 2 -IN A (in), 3 +IN A (in)
part B pins: 5 +IN B (in), 6 -IN B (in), 7 OUT B (out)

## AD8617ACPZ-R2
designator U?
Double Channel Single-Supply Operation Operational Amplifier, 400 KHz BW, 100 mV/us SR, Industrial, 8-pin QFN (CP-8-9), Reel; Generic Part Number: AD8617; PartNumber: AD8617ACPZ-R2; Amplifiers Per Package: 2; Automotive Qualified: Yes; Input Bias Current: 200fA; Input Offset Voltage: 400uV; Iq/Amp: 38uA; Small Signal Bandwidth: 400KHz; V Span Max: 5V; V Span Min: 1.8V; DatasheetVersion: Rev. E; PackageVersion: 051909-A; PackageReference: CP-8-9; PackageDescription: 8-Pin Lead Frame Chip Scale Package, Body 3 x 3 mm, Pitch 0.5 mm; Supplier Part Number 1: AD8617ACPZ-R2TR-ND; Supplier Part Number 2: AD8617ACPZ-R2CT-ND; Supplier Part Number 3: AD8617ACPZ-R2DKR-ND; Supplier Part Number 4: 52R8173; Slew Rate: 100mV/us; Mounting Technology: Surface Mount; ComponentLink1Description: Manufacturer URL; ComponentLink2Description: Datasheet; ComponentLink3Description: Package Specification; ComponentLink4Description: Reference Circuit
footprint DFN8_0.5-PAD(3X3) (Footprint not found)
pins on every part: 4 -V (power), 8 +V (power), 9 EP (power)
part A pins: 1 OUT A (out), 2 -IN A (in), 3 +IN A (in)
part B pins: 5 +IN B (in), 6 -IN B (in), 7 OUT B (out)

## AD8617ACPZ-R7
designator U?
Double Channel Single-Supply Operation Operational Amplifier, 400 KHz BW, 100 mV/us SR, Industrial, 8-pin QFN (CP-8-9), Reel; Generic Part Number: AD8617; PartNumber: AD8617ACPZ-R7; Amplifiers Per Package: 2; Automotive Qualified: Yes; Input Bias Current: 200fA; Input Offset Voltage: 400uV; Iq/Amp: 38uA; Small Signal Bandwidth: 400KHz; V Span Max: 5V; V Span Min: 1.8V; DatasheetVersion: Rev. E; PackageVersion: 051909-A; PackageReference: CP-8-9; PackageDescription: 8-Pin Lead Frame Chip Scale Package, Body 3 x 3 mm, Pitch 0.5 mm; Supplier Part Number 1: AD8617ACPZ-R7-ND; Supplier Part Number 2: 52R8174; Slew Rate: 100mV/us; Mounting Technology: Surface Mount; ComponentLink1Description: Manufacturer URL; ComponentLink2Description: Datasheet; ComponentLink3Description: Package Specification; ComponentLink4Description: Reference Circuit
footprint DFN8_0.5-PAD(3X3) (Footprint not found)
pins on every part: 4 -V (power), 8 +V (power), 9 EP (power)
part A pins: 1 OUT A (out), 2 -IN A (in), 3 +IN A (in)
part B pins: 5 +IN B (in), 6 -IN B (in), 7 OUT B (out)

## AD8617ARMZ
designator U?
Double Channel Single-Supply Operation Operational Amplifier, 400 KHz BW, 100 mV/us SR, Industrial, 8-pin SOP (RM-8), Tube; Generic Part Number: AD8617; PartNumber: AD8617ARMZ; Amplifiers Per Package: 2; Automotive Qualified: Yes; Input Bias Current: 200fA; Input Offset Voltage: 400uV; Iq/Amp: 38uA; Small Signal Bandwidth: 400KHz; V Span Max: 5V; V Span Min: 1.8V; DatasheetVersion: Rev. E; PackageReference: RM-8; PackageDescription: 8-Pin Mini Small Outline Package, Body 3 x 3 mm, Pitch 0.65 mm; Supplier Part Number 1: AD8617ARMZ-ND; Supplier Part Number 2: 34P3247; Slew Rate: 100mV/us; Mounting Technology: Surface Mount; Code_JEDEC: MO-187-AA; ComponentLink1Description: Manufacturer URL; ComponentLink2Description: Datasheet; ComponentLink3Description: Package Specification; ComponentLink4Description: Reference Circuit
footprint VSSOP8_0.65 (Footprint not found)
pins on every part: 4 -V (power), 8 +V (power)
part A pins: 1 OUT A (out), 2 -IN A (in), 3 +IN A (in)
part B pins: 5 +IN B (in), 6 -IN B (in), 7 OUT B (out)

## AD8620AR
designator U?
Double Channel Low Offset Voltage Operational Amplifier, 25 MHz BW, 50 V/us SR, Industrial, 8-pin SOIC (R-8), Tube; Generic Part Number: AD8620; PartNumber: AD8620AR; Amplifiers Per Package: 2; Input Bias Current: 2pA; Input Offset Voltage: 85uV; Iq/Amp: 3.5mA; Slew Rate: 50V/us; Small Signal Bandwidth: 25MHz; V Span Max: 27V; V Span Min: 10V; DatasheetVersion: Rev. F; PackageVersion: 060506-A; PackageReference: R-8; PackageDescription: 8-Pin Standard Small Outline Package, Body 3.9 x 4.9 mm, Pitch 1.27 mm; Supplier Part Number 1: AD8620AR-ND; Mounting Technology: Surface Mount; Code_JEDEC: MS-012-AA; ComponentLink1Description: Manufacturer URL; ComponentLink2Description: Datasheet; ComponentLink3Description: Package Specification; ComponentLink4Description: Reference Circuit
footprint SOIC8_1.27 (Footprint not found)
pins on every part: 4 -V (power), 8 +V (power)
part A pins: 1 OUT A (out), 2 -IN A (in), 3 +IN A (in)
part B pins: 5 +IN B (in), 6 -IN B (in), 7 OUT B (out)

## AD8622ARMZ
designator U?
Double Channel Rail-to-Rail Operational Amplifier, 560 KHz BW, 280 mV/us SR, Industrial, 8-pin SOP (RM-8), Tube; Generic Part Number: AD8622; PartNumber: AD8622ARMZ; Amplifiers Per Package: 2; Input Bias Current: 45pA; Input Offset Voltage: 10uV; Iq/Amp: 215uA; Small Signal Bandwidth: 560KHz; V Span Max: 30V; V Span Min: 5V; DatasheetVersion: Rev. C; PackageReference: RM-8; PackageDescription: 8-Pin Mini Small Outline Package, Body 3 x 3 mm, Pitch 0.65 mm; Supplier Part Number 1: AD8622ARMZ-ND; Supplier Part Number 2: 26R2477; Slew Rate: 280mV/us; Mounting Technology: Surface Mount; Code_JEDEC: MO-187-AA; ComponentLink1Description: Manufacturer URL; ComponentLink2Description: Datasheet; ComponentLink3Description: Package Specification; ComponentLink4Description: Reference Circuit
footprint VSSOP8_0.65 (Footprint not found)
pins on every part: 4 -V (power), 8 +V (power)
part A pins: 1 OUT A (out), 2 -IN A (in), 3 +IN A (in)
part B pins: 5 +IN B (in), 6 -IN B (in), 7 OUT B (out)

## AD8624ACPZ-R2
designator U?
Quad Channel Low Offset Voltage Operational Amplifier, 560 KHz BW, 480 mV/us SR, Industrial, 16-pin QFN (CP-16-17), Reel; Generic Part Number: AD8624; PartNumber: AD8624ACPZ-R2; Amplifiers Per Package: 4; Input Bias Current: 45pA; Input Offset Voltage: 10uV; Iq/Amp: 215uA; Small Signal Bandwidth: 560KHz; V Span Max: 36V; V Span Min: 4V; DatasheetVersion: Rev. C; PackageVersion: 08-16-2010-C; PackageReference: CP-16-17; PackageDescription: 16-Pin Lead Frame Chip Scale Package, Body 4 x 4 mm, Pitch 0.65 mm; Supplier Part Number 1: AD8624ACPZ-R2TR-ND; Supplier Part Number 2: AD8624ACPZ-R2CT-ND; Supplier Part Number 3: AD8624ACPZ-R2DKR-ND; Supplier Part Number 4: 1827372; Supplier Part Number 5: 80R8183; Supplier Part Number 6: 67R2268; Packing: Reel; Slew Rate: 480mV/us; Mounting Technology: Surface Mount; Code_JEDEC: MO-220-WGGC; ComponentLink1Description: Manufacturer URL; ComponentLink2Description: Datasheet; ComponentLink3Description: Package Specification
footprint QFN16_0.65-PAD(4x4) (Footprint not found)
part A pins: 1 -IN A (in), 2 +IN A (in), 15 OUT A (out)
part B pins: 4 +IN B (in), 5 -IN B (in), 6 OUT B (out)
part C pins: 7 OUT C (out), 8 -IN C (in), 9 +IN C (in)
part D pins: 11 +IN D (in), 12 -IN D (in), 14 OUT D (out)
part E pins: 3 +V (power), 10 -V (power), 13 NC, 16 NC, 17 EP (power) "IT IS RECOMMENDED THAT THE EXPOSED PAD BE CONNECTED TO V-."

## AD8624ACPZ-R7
designator U?
Quad Channel Low Offset Voltage Operational Amplifier, 560 KHz BW, 480 mV/us SR, Industrial, 16-pin QFN (CP-16-17), Reel; Generic Part Number: AD8624; PartNumber: AD8624ACPZ-R7; Amplifiers Per Package: 4; Input Bias Current: 45pA; Input Offset Voltage: 10uV; Iq/Amp: 215uA; Small Signal Bandwidth: 560KHz; V Span Max: 36V; V Span Min: 4V; DatasheetVersion: Rev. C; PackageVersion: 08-16-2010-C; PackageReference: CP-16-17; PackageDescription: 16-Pin Lead Frame Chip Scale Package, Body 4 x 4 mm, Pitch 0.65 mm; Supplier Part Number 1: AD8624ACPZ-R7-ND; Supplier Part Number 2: 67R2269; Packing: Reel; Slew Rate: 480mV/us; Mounting Technology: Surface Mount; Code_JEDEC: MO-220-WGGC; ComponentLink1Description: Manufacturer URL; ComponentLink2Description: Datasheet; ComponentLink3Description: Package Specification
footprint QFN16_0.65-PAD(4x4) (Footprint not found)
part A pins: 1 -IN A (in), 2 +IN A (in), 15 OUT A (out)
part B pins: 4 +IN B (in), 5 -IN B (in), 6 OUT B (out)
part C pins: 7 OUT C (out), 8 -IN C (in), 9 +IN C (in)
part D pins: 11 +IN D (in), 12 -IN D (in), 14 OUT D (out)
part E pins: 3 +V (power), 10 -V (power), 13 NC, 16 NC, 17 EP (power) "IT IS RECOMMENDED THAT THE EXPOSED PAD BE CONNECTED TO V-."

## AD8626ARMZ
designator U?
Double Channel Very Low Input Bias Current Operational Amplifier, 5 MHz BW, 5 V/us SR, Industrial, 8-pin SOP (RM-8), Tube; Generic Part Number: AD8626; PartNumber: AD8626ARMZ; Amplifiers Per Package: 2; Input Bias Current: 250fA; Input Offset Voltage: 50uV; Iq/Amp: 850uA; Slew Rate: 5V/us; Small Signal Bandwidth: 5MHz; V Span Max: 26V; V Span Min: 5V; DatasheetVersion: Rev. E; PackageReference: RM-8; PackageDescription: 8-Pin Mini Small Outline Package, Body 3 x 3 mm, Pitch 0.65 mm; Supplier Part Number 1: AD8626ARMZ-ND; Supplier Part Number 2: 45P6467; Mounting Technology: Surface Mount; Code_JEDEC: MO-187-AA; ComponentLink1Description: Manufacturer URL; ComponentLink2Description: Datasheet; ComponentLink3Description: Package Specification
footprint VSSOP8_0.65 (Footprint not found)
pins on every part: 4 -V (power), 8 +V (power)
part A pins: 1 OUT A (out), 2 -IN A (in), 3 +IN A (in)
part B pins: 5 +IN B (in), 6 -IN B (in), 7 OUT B (out)

## AD8627AKSZ-R2
designator U?
Single Channel Very Low Input Bias Current Operational Amplifier, 5 MHz BW, 5 V/us SR, Industrial, 5-pin SOT23 (KS-5), Reel; Generic Part Number: AD8627; PartNumber: AD8627AKSZ-R2; Amplifiers Per Package: 1; Input Bias Current: 250fA; Input Offset Voltage: 50uV; Iq/Amp: 850uA; Slew Rate: 5V/us; Small Signal Bandwidth: 5MHz; V Span Max: 26V; V Span Min: 5V; DatasheetVersion: Rev. E; PackageVersion: 072809-A; PackageReference: KS-5; PackageDescription: 5-Pin Thin Shrink Small Outline Transistor Package, Body 2 x 1.25 mm, Pitch 0.65 mm; Supplier Part Number 1: AD8627AKSZ-R2TR-ND; Supplier Part Number 2: AD8627AKSZ-R2CT-ND; Supplier Part Number 3: AD8627AKSZ-R2DKR-ND; Supplier Part Number 4: 1838871; Supplier Part Number 5: 19M8933; Mounting Technology: Surface Mount; Code_JEDEC: MO-203-AA; ComponentLink1Description: Manufacturer URL; ComponentLink2Description: Datasheet; ComponentLink3Description: Package Specification; ComponentLink4Description: Reference Circuit
footprint SOT353 (Footprint not found)
pins: 1 OUT A (out), 2 -V (power), 3 +IN (in), 4 -IN (in), 5 +V (power)

## AD8628ARTZ-R2
designator U?
Single Channel RRIO Operational Amplifier, 2.5 MHz BW, 1 V/us SR, Industrial, 5-pin SOT23 (RJ-5), Reel; Generic Part Number: AD8628; PartNumber: AD8628ARTZ-R2; Amplifiers Per Package: 1; Automotive Qualified: Yes; Input Bias Current: 30pA; Input Offset Voltage: 1uV; Iq/Amp: 1.1mA; Slew Rate: 1V/us; Small Signal Bandwidth: 2.5MHz; V Span Max: 6V; V Span Min: 2.7V; DatasheetVersion: Rev. I; PackageVersion: 121608-A; PackageReference: RJ-5; PackageDescription: 5-Pin Small Outline Transistor Package, Body 2.9 x 1.6 mm, Pitch 0.95 mm; Supplier Part Number 1: AD8628ARTZ-R2TR-ND; Supplier Part Number 2: AD8628ARTZ-R2CT-ND; Supplier Part Number 3: AD8628ARTZ-R2DKR-ND; Supplier Part Number 4: 1319476; Supplier Part Number 5: 19M8934; Mounting Technology: Surface Mount; Code_JEDEC: MO-178-AA; ComponentLink1Description: Manufacturer URL; ComponentLink2Description: Datasheet; ComponentLink3Description: Package Specification; ComponentLink4Description: Reference Circuit
footprint SOT23-5 (Footprint not found)
pins: 1 OUT (out), 2 -V (power), 3 +IN (in), 4 -IN (in), 5 +V (power)

## AD8628AUJZ-R2
designator U?
Single Channel RRIO Operational Amplifier, 2.5 MHz BW, 1 V/us SR, Industrial, 5-pin SOT23 (UJ-5), Reel; Generic Part Number: AD8628; PartNumber: AD8628AUJZ-R2; Amplifiers Per Package: 1; Automotive Qualified: Yes; Input Bias Current: 30pA; Input Offset Voltage: 1uV; Iq/Amp: 1.1mA; Slew Rate: 1V/us; Small Signal Bandwidth: 2.5MHz; V Span Max: 6V; V Span Min: 2.7V; DatasheetVersion: Rev. I; PackageVersion: 100708-A; PackageReference: UJ-5; PackageDescription: 5-Pin Thin Small Outline Transistor Package, Body 2.9 x 1.6 mm, Pitch 0.95 mm; Supplier Part Number 1: AD8628AUJZ-R2TR-ND; Supplier Part Number 2: AD8628AUJZ-R2CT-ND; Supplier Part Number 3: AD8628AUJZ-R2DKR-ND; Supplier Part Number 4: 1701158; Supplier Part Number 5: 59K7002; Mounting Technology: Surface Mount; Code_JEDEC: MO-193-AB; ComponentLink1Description: Manufacturer URL; ComponentLink2Description: Datasheet; ComponentLink3Description: Package Specification; ComponentLink4Description: Reference Circuit
footprint SOT23-5 (Footprint not found)
pins: 1 OUT (out), 2 -V (power), 3 +IN (in), 4 -IN (in), 5 +V (power)

## AD8628WARTZ-R7
designator U?
Single Channel RRIO Operational Amplifier, 2.5 MHz BW, 1 V/us SR, Automotive, 5-pin SOT23 (RJ-5), Reel; Generic Part Number: AD8628; PartNumber: AD8628WARTZ-R7; Amplifiers Per Package: 1; Automotive Qualified: Yes; Input Bias Current: 30pA; Input Offset Voltage: 1uV; Iq/Amp: 1.1mA; Slew Rate: 1V/us; Small Signal Bandwidth: 2.5MHz; V Span Max: 6V; V Span Min: 2.7V; DatasheetVersion: Rev. I; PackageVersion: 121608-A; PackageReference: RJ-5; PackageDescription: 5-Pin Small Outline Transistor Package, Body 2.9 x 1.6 mm, Pitch 0.95 mm; Supplier Part Number 1: AD8628WARTZ-R7TR-ND; Supplier Part Number 2: AD8628WARTZ-R7CT-ND; Supplier Part Number 3: AD8628WARTZ-R7DKR-ND; Supplier Part Number 4: 74R6006; Mounting Technology: Surface Mount; Code_JEDEC: MO-178-AA; ComponentLink1Description: Manufacturer URL; ComponentLink2Description: Datasheet; ComponentLink3Description: Package Specification; ComponentLink4Description: Reference Circuit
footprint SOT23-5 (Footprint not found)
pins: 1 OUT (out), 2 -V (power), 3 +IN (in), 4 -IN (in), 5 +V (power)
